# Altium footprint library Library.PcbLib: 224 footprints (part 4 of 16)
Each footprint in its own frame and in the unit in brackets; x right, y up, seen from the top. Pads: shape width x height; smd on the part's side, far side on the other; paste and mask are expansions set on the pad; w line width, h text height; cw(c..) or ccw(c..) is an arc to the next point about the centre after c.
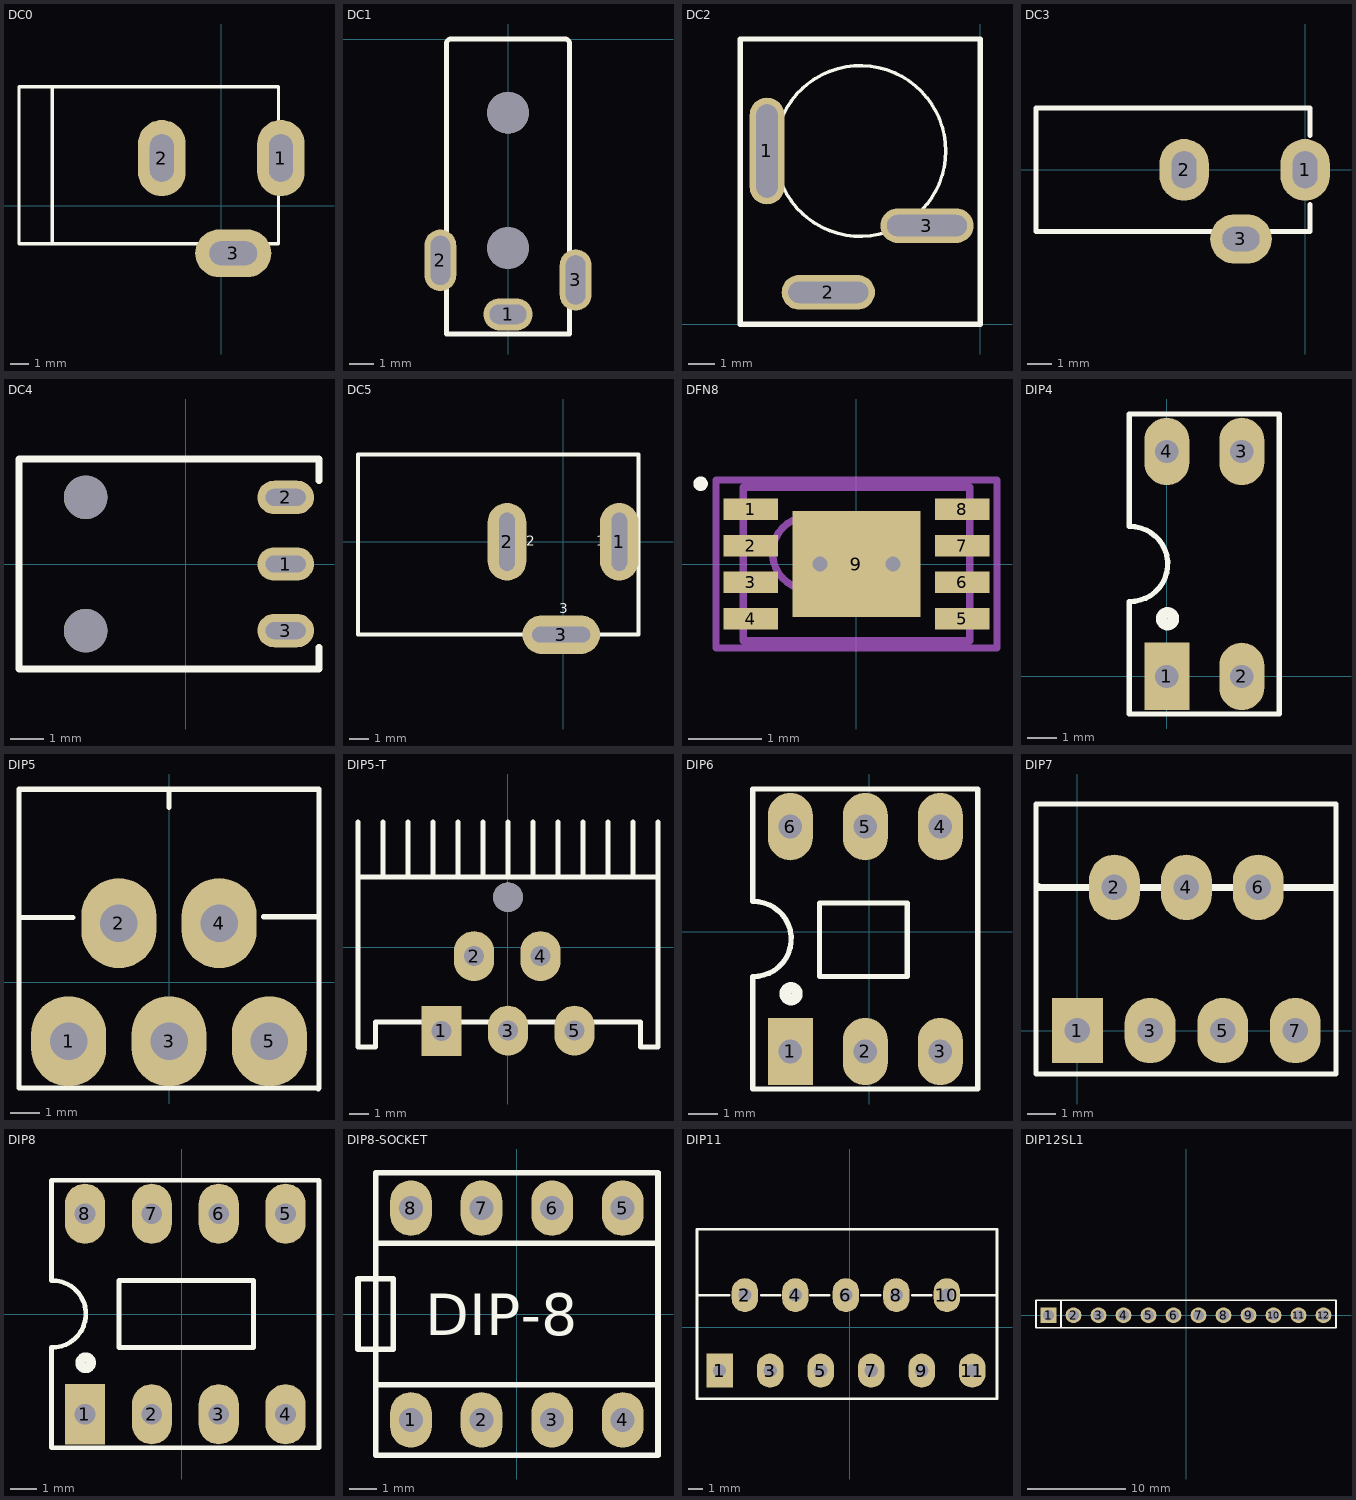
[diagram p3: the footprints below, top view; thin cyan lines are the x and y axes]

## DC0 [mil] "Jac DC input"
height 200
pads (3):
  oval 100x160 hole 50 slot 100 at 90 deg: 1(125,100) 2(-125,100)
  oval 160x100 hole 50 slot 100 at 0 deg: 3(25,-100)
Top Overlay:
  lines w7: -355,-80 -355,250 ; -425,-80 -425,250 120,250 120,-80 -425,-80
3D body "SW3dPS-dc range - dc connector[4840.2201].STEP": height 433.67, standoff -137.2, extent -410.35,-105.12 134,269.12

## DC1 [mm] "WR-DC_DC Power Jack_Right Angled_THT Center Pin ?0.65_Plug ID ?0.75_Plug OD ?2.35_with Peg"
height 5
pads (5):
  oval 2x1.3 hole 0.8 slot 1.5 at 0 deg: 1(0,-11.2)
  oval 1.3x2.5 hole 0.8 slot 2 at 90 deg: 2(-2.75,-9) 3(2.75,-9.8)
  round 1.7 hole 1.7 unplated: ""(0,-8.5) ""(0,-3)
Top Overlay:
  lines w0.2: -2.5,-12 -2.5,-0.2 cw(c-2.312,-0.188) -2.3,0 2.3,0 cw(c2.312,-0.188) 2.5,-0.2 2.5,-12 -2.5,-12
3D body "694101308002.stp": height 5, standoff -2.3, extent -2.9,-12 2.9,0

## DC2 [mm] "WR-DC_DC Power Jack_Vertical_THT WR-DC_DC Power Jack_Vertical_THT"
height 14
pads (3):
  oval 1.3x4 hole 0.8 slot 3.5 at 90 deg: 1(-8,6.5)
  oval 3.5x1.3 hole 0.8 slot 3 at 0 deg: 2(-5.7,1.2) 3(-2,3.7)
Top Overlay:
  circle w0.127: c-4.5,6.5 r3.2
  lines w0.2: -9,0 0,0 0,10.7 -9,10.7 -9,0
3D body "694106402002.stp": height 14, standoff -3.6, extent -9,0 0,10.7

## DC3 [mm] "WR-DC_DC Power Jack_Right Angled_THT Center Pin ?1.0_Plug ID ?1.05_Plug OD ?3.5"
height 7.4
pads (3):
  oval 2x2.5 hole 1 slot 1.5 at 90 deg: 1(0,0) 2(-4.9,0)
  oval 2.5x2 hole 1 slot 1.5 at 0 deg: 3(-2.6,-2.8)
Top Overlay:
  lines w0.2: -3.8,-2.5 -10.9,-2.5 -10.9,2.5 0.2,2.5 0.2,1.4 ; -1.4,-2.5 0.2,-2.5 0.2,-1.4
3D body "694102303002.stp": height 7.81, standoff -2.59, extent -10.9,-3 0.4,2.5

## DC4 [mm] "WR-DC_DC Power Jack_Right Angled_THT Center Pin ?1.0_Plug ID ?1.05_Plug OD ?3.5_with Peg"
height 5
pads (5):
  oval 1.7x1 hole 0.5 slot 1.2 at 0 deg: 1(3,0) 2(3,2) 3(3,-2)
  round 1.3 hole 1.3 unplated: ""(-3,-2) ""(-3,2)
Top Overlay:
  lines w0.2: 4,-2.5 4,-3.15 -5,-3.15 -5,3.15 4,3.15 4,2.5
3D body "694102304002.stp": height 5, standoff -3.05, extent -5,-3.149 4,3.151

## DC5 [mm] "WR-DC_DC Power Jack_Right Angled_THT Center Pin ?2.0_Plug ID ?2.05_Plug OD ?5.5"
height 10.7
pads (3):
  oval 2x4 hole 0.8 slot 3 at 90 deg: 1(2.9,0) 2(-2.9,0)
  oval 4x2 hole 0.8 slot 3 at 0 deg: 3(-0.1,-4.8)
Top Overlay:
  lines w0.2: -2.1,-4.8 -10.6,-4.8 -10.6,4.5 3.9,4.5 3.9,-4.8 1.9,-4.8
  text "3" at -0.2,-3.7 h0.5
  text "2" at -1.9,-0.2 h0.5
  text "1" at 1.7,-0.2 h0.5
3D body "694106301002.stp": height 10.7, standoff -3.8, extent -10.6,-4.9 3.9,4.5

## DFN8 [mm] "SON, 8-Leads, Body 2x3mm, Pitch 0.5mm, Microchip Recommended"
height 1
pads (9):
  rect 0.75x0.3 smd: 1(-1.45,0.75) 2(-1.45,0.25) 3(-1.45,-0.25) 4(-1.45,-0.75) 5(1.45,-0.75) 6(1.45,-0.25) 7(1.45,0.25) 8(1.45,0.75)
  rect 1.75x1.45 smd: 9(0,0)
via 0.5,0 diameter 0.5 hole 0.2
via -0.5,0 diameter 0.5 hole 0.2
Top Overlay:
  circle w0.1: c-2.135,1.1 r0.05
Mechanical 13:
  circle w0.1: c-0.65,0.15 r0.5
  lines w0.1: -1.55,-1.05 -1.55,1.05 1.55,1.05 1.55,-1.05 -1.55,-1.05
Mechanical 15:
  lines w0.1: -0.5,0 0.5,0 ; 0,-0.5 0,0.5 ; -1.925,-1.15 -1.925,1.15 1.925,1.15 1.925,-1.15 -1.925,-1.15
3D body "User Library-DFN-8-1.step": height 0.8, standoff 0, extent -1.55,-1 1.55,1

## DIP4 [mil]
height 100
pads (4):
  rect 60x90 hole 31: 1(0,0)
  oval 60x90 hole 31: 2(100,0) 3(100,300) 4(0,300)
Top Overlay:
  circle w15: c1,77 r8
  lines w7: -50.38,100.05 ccw(c-48.69,150.02) -50,200 ; -50,100 -50,-50 150,-50 150,350 -50,350 -50,201
3D body "SW3DPS-DIP4-DEFAULT.STEP": height 169.69, standoff -129.13, extent -59.06,-10 159.06,304.96

## DIP5 [mm]
pads (5):
  oval 2.54x3.048 hole 1.27: 1(-3.4,-2) 2(-1.7,2) 3(0,-2) 4(1.7,2) 5(3.4,-2)
Top Overlay:
  lines w0.178: -5.076,2.191 -3.248,2.191 ; 0,5.918 0,6.502 ; 3.204,2.216 5.033,2.216 ; -5.08,-3.581 5.029,-3.581 5.055,-3.607 5.08,-3.581 5.08,6.534 -5.08,6.534 -5.08,-3.581
3D body "TO220-5.STEP": height 18.81, standoff -9.47, extent -4.993,-2.246 5.207,6.31

## DIP5-T [mil]
pads (6):
  rect 80x100 hole 40: 1(-132,-167.09)
  oval 80x100 hole 40: 2(-67,-18) 3(1,-167) 4(66,-18) 5(134,-167)
  round 59.06 hole 59.06: ""(1,100)
Top Overlay:
  lines w10: -299,140 301,140 ; -299,250 -299,-200 -264,-200 -264,-150 266,-150 266,-200 301,-200 301,250 ; -249,140 -249,250 ; -199,140 -199,250 ; -149,140 -149,250 ; -99,140 -99,250 ; -49,140 -49,250 ; 1,140 1,250 ; 51,140 51,250 ; 101,140 101,250 ; 151,140 151,250 ; 201,140 201,250 ; 251,140 251,250
3D body "SW3dPS-TO220-5.STEP": height 859.05, standoff -85.43, extent -199,-174.91 201,149.5

## DIP6 [mil]
height 100
pads (6):
  rect 60x90 hole 31.5: 1(-105,-160)
  oval 60x90 hole 31.5: 2(-5,-160) 3(95,-160) 4(95,140) 5(-5,140) 6(-105,140)
Top Overlay:
  circle w15: c-104,-83 r8
  lines w7: -155.38,-59.95 ccw(c-153.69,-9.98) -155,40 ; -155,-60 -155,-210 145,-210 145,190 -155,190 -155,41 ; -66,-60 51,-60 51,38 -66,38 -66,-60
3D body "SW3DPS-DIP6-DEFAULT.STEP": height 169.69, standoff -129.13, extent -163.11,-167.48 155,147.48

## DIP7 [mil]
pads (7):
  rect 70x90 hole 35: 1(0,0)
  oval 70x90 hole 35: 2(51,197) 3(100,0) 4(150,197) 5(200,0) 6(249,197) 7(300,0)
Top Overlay:
  lines w7: -57,-60 356,-60 356,312 -57,312 -57,-60
  lines w10: -54,198 -54,197 354,197
3D body "User Library-TO-220(T).STEP": height 756.77, standoff -77.87, extent -50.57,-11.02 351,311.02

## DIP8 [mil] "DIP, 8-Leads, Row Spacing 7.62mm, Pitch 2.54mm, Body 9.91x6.73mm"
height 200
pads (8):
  rect 60x90 hole 31: 1(-145,-150)
  oval 60x90 hole 31: 2(-45,-150) 3(55,-150) 4(155,-150) 5(155,150) 6(55,150) 7(-45,150) 8(-145,150)
Top Overlay:
  circle w15: c-144,-73 r8
  lines w7: -195.38,-49.95 ccw(c-193.69,0.02) -195,50 ; -195,-50 -195,-200 205,-200 205,200 -195,200 -195,51 ; -94,-50 107,-50 107,50 -94,50 -94,-50
3D body "User Library-DIP8-300-metric.step": height 177.17, standoff -137.8, extent -212.6,-152.76 212.6,152.77

## DIP8-SOCKET [mm] "DIP, 8-Leads, Row Spacing 7.62mm, Pitch 2.54mm, Body 9.91x6.73mm"
pads (8):
  oval 1.5x2 hole 0.864: 1(-3.81,-3.81) 2(-1.27,-3.81) 3(1.27,-3.81) 4(3.81,-3.81) 5(3.81,3.81) 6(1.27,3.81) 7(-1.27,3.81) 8(-3.81,3.81)
Top Overlay:
  lines w0.203: -5.08,-2.54 5.08,-2.54 ; -5.08,-2.54 -5.08,2.54 ; -5.08,-2.54 5.08,-2.54 ; -5.08,-2.54 -5.08,2.54 ; -5.08,-2.54 -5.08,-5.08 5.08,-5.08 5.08,2.54 ; -5.08,-2.54 -5.08,-1.27 -4.445,-1.27 ; -5.08,2.54 5.08,2.54 ; -5.08,2.54 5.08,2.54 ; -4.445,-1.27 -4.445,1.27 ; -4.445,-1.27 -5.715,-1.27 -5.715,1.27 -4.445,1.27 ; -4.445,-1.27 -4.445,1.27 ; -4.445,1.27 -5.08,1.27 -5.08,5.08 5.08,5.08 5.08,2.54 ; 5.08,-2.54 5.08,2.54 ; 5.08,-2.54 5.08,2.54
  text "DIP-8" at -3.302,-0.762 h1.5
3D body "User Library-DIP8-300-metric.step": height 8.5, standoff 0.5, extent -5.654,-4.007 5.146,3.753
3D body "Socket 8.step": height 4.5, standoff -3.09, extent -5.08,-5.08 5.08,5.08

## DIP11 [mil]
pads (11):
  rect 70x90 hole 35: 1(-345,-115)
  oval 70x90 hole 35: 2(-278.07,85) 3(-211.14,-115) 4(-144.21,85) 5(-77.28,-115) 6(-10.35,85) 7(56.57,-115) 8(123.5,85) 9(190.43,-115) 10(257.36,85) 11(324.29,-115)
Top Overlay:
  lines w7: -405,85 -320,85 ; -235,85 -185,85 ; -105,85 -55,85 ; 30,85 80,85 ; 165,85 215,85 ; 285,85 390,85 ; -405,-190 390,-190 390,260 -405,260 -405,-190
3D body "User Library-TDA 2004R.step": height 826.77, standoff -138.19, extent -404.09,-120 384.09,252.82

## DIP12SL1 [mm]
height 8.54
pads (12):
  rect 1.6x1.6 hole 1.1: 1(-13.97,0)
  round 1.6 hole 1.1: 2(-11.43,0) 3(-8.89,0) 4(-6.35,0) 5(-3.81,0) 6(-1.27,0) 7(1.27,0) 8(3.81,0) 9(6.35,0) 10(8.89,0) 11(11.43,0) 12(13.97,0)
Top Overlay:
  lines w0.2: -12.7,-1.27 -12.7,1.397 ; -15.24,-1.27 15.24,-1.27 15.24,1.524 -13.081,1.524 -15.24,1.524 -15.24,-1.27
3D body: height 18, standoff 8, extent -14.986,1.27 14.859,1.651
3D body: height 12, standoff 4.5, extent -15.367,-1.397 15.24,1.524
3D body "61301211121.stp": height 10.17, standoff -1.37, extent -15.24,-1.27 15.24,1.27